# Altium footprint library Cty1.PcbLib: 869 footprints (part 30 of 55)
Each footprint in its own frame and in the unit in brackets; x right, y up, seen from the top. Pads: shape width x height; smd on the part's side, far side on the other; paste and mask are expansions set on the pad; w line width, h text height; cw(c..) or ccw(c..) is an arc to the next point about the centre after c.
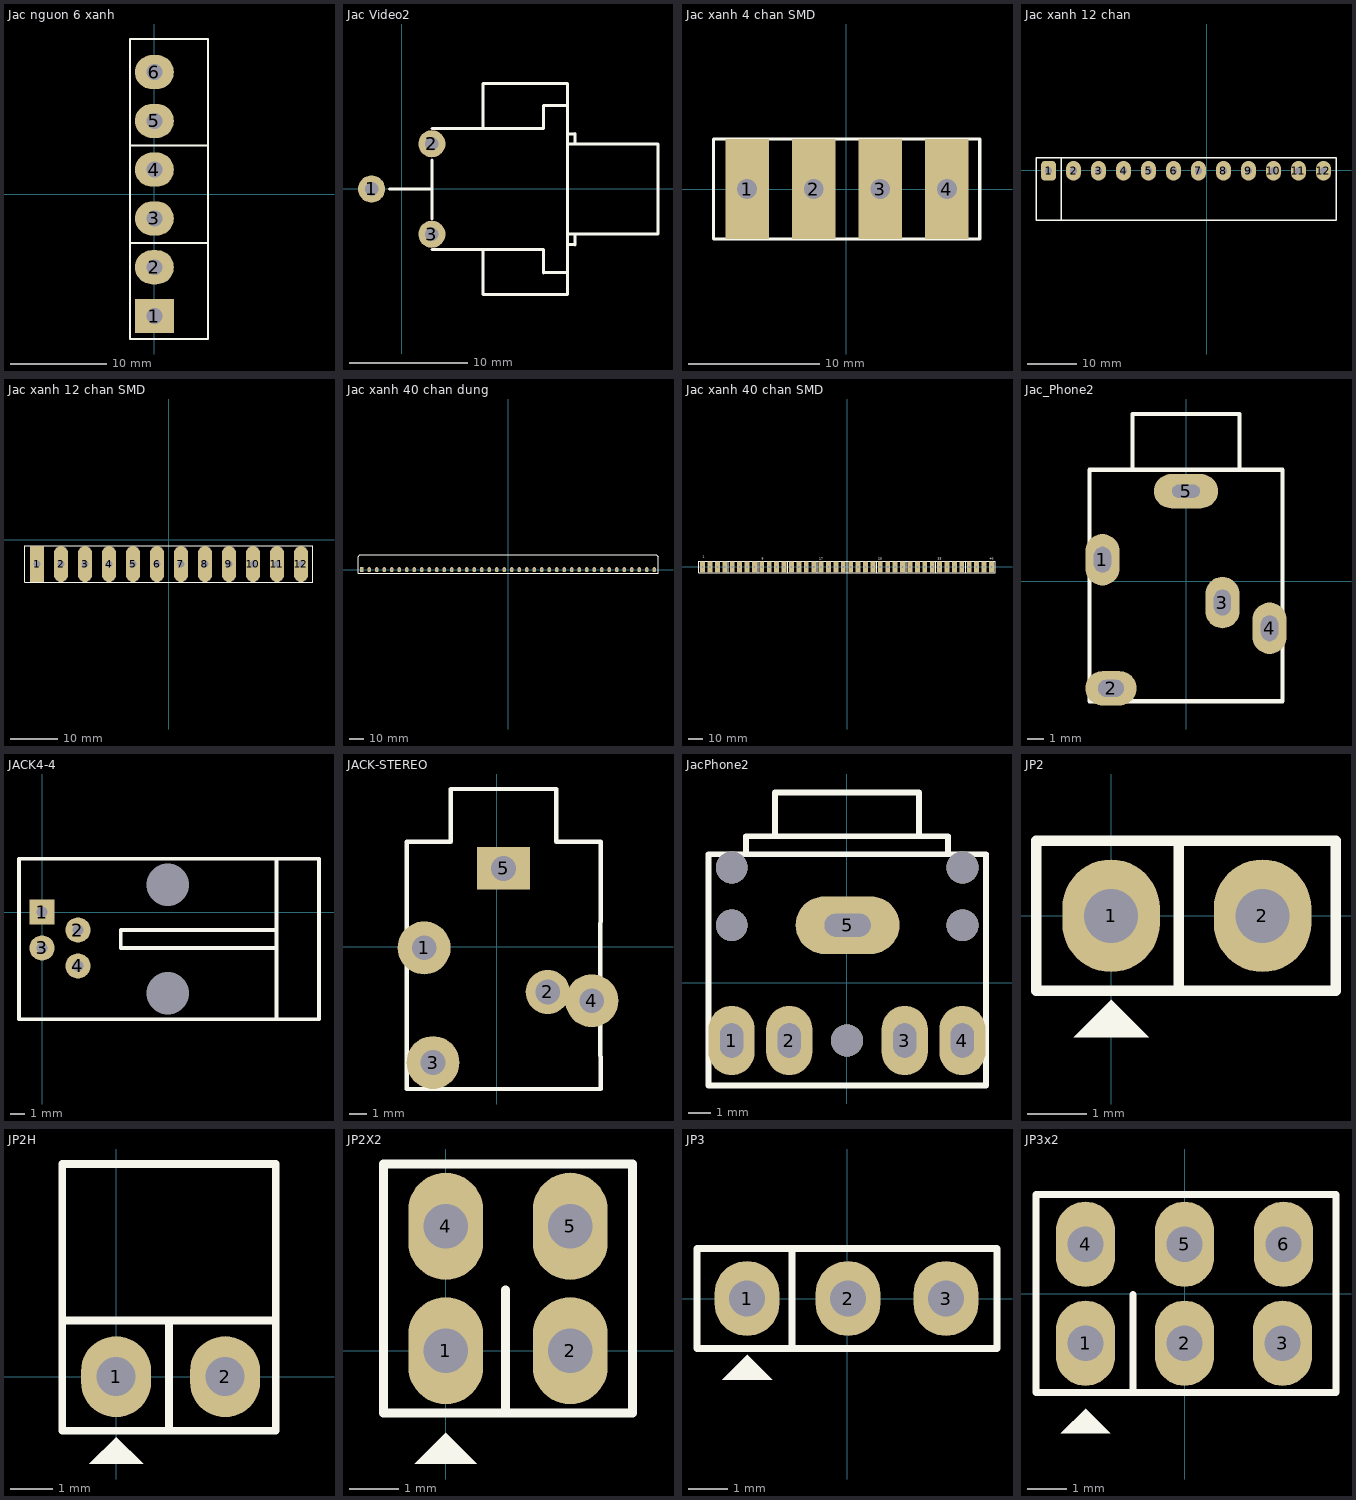
[diagram p29: the footprints below, top view; thin cyan lines are the x and y axes]

## Jac nguon 6 xanh [mil] "Cau dau nguon xanh"
pads (6):
  rect 160x140 hole 65: 1(0,-500)
  oval 160x140 hole 65: 2(0,-300) 3(0,-100) 4(0,100) 5(0,300) 6(0,500)
Top Overlay:
  lines w8: -100,-200.25 215,-200.25 ; -100,200 215,199.75 ; -100,-594.25 220,-594.25 220,635.75 -100,635.75 -100,-594.25

## Jac Video2 [mil] "Jac Video Stereo"
pads (3):
  round 90 hole 45: 1(-100,0) 2(100,150) 3(100,-150)
Top Overlay:
  lines w10: -40,0 101,0 ; 100,-200 470,-200 ; 100,200 470,200 470,277 550,277 ; 101,-99 101,96 ; 270,200 270,350 550,350 ; 470,-277 548,-277 549,-276 ; 550,-277 550,-350 270,-350 ; 550,-150 850,-150 850,150 550,150 ; 551,-184 574,-184 575,-185 575,-151 ; 551,183 574,183 575,184 575,150 ; 270,-350 270,-200 270,-350 ; 470,-200 470,-278 470,-200 ; 550,277 550,350 ; 550,277 550,350 ; 550,-275 550,275 550,-275

## Jac xanh 4 chan SMD [mil] "Jac xanh duc"
pads (4):
  rect 130x300 hole 59.05: 1(-297.27,0) 2(-97.73,0) 3(101.82,0) 4(301.36,0)
Top Overlay:
  lines w10: -397.73,-150 400,-150 400,150 -397.73,150 -397.73,-150

## Jac xanh 12 chan [mm] "Jac xanh duc"
pads (12):
  rrect50% 3x4 hole 1.5: 1(-32.131,-0.127)
  oval 3x4 hole 1.5: 2(-27.063,-0.127) 3(-21.994,-0.127) 4(-16.926,-0.127) 5(-11.857,-0.127) 6(-6.789,-0.127) 7(-1.72,-0.127) 8(3.348,-0.127) 9(8.417,-0.127) 10(13.485,-0.127) 11(18.554,-0.127) 12(23.622,-0.127)
Top Overlay:
  lines w0.254: -29.591,-10.16 -29.591,2.413 ; -34.671,-10.16 26.162,-10.16 26.162,2.54 -34.671,2.54 -34.671,-10.16

## Jac xanh 12 chan SMD [mm] "Jac xanh duc"
pads (12):
  rect 3x7.62 hole 1.5: 1(-27.871,-5.08)
  oval 3x7.62 hole 1.5: 2(-22.802,-5.08) 3(-17.734,-5.08) 4(-12.665,-5.08) 5(-7.597,-5.08) 6(-2.528,-5.08) 7(2.54,-5.08) 8(7.608,-5.08) 9(12.677,-5.08) 10(17.745,-5.08) 11(22.814,-5.08) 12(27.882,-5.08)
Top Overlay:
  lines w0.254: -30.422,-8.89 30.411,-8.89 30.411,-1.27 -30.422,-1.27 -30.422,-8.89

## Jac xanh 40 chan dung [mil] "Jac xanh duc"
height 200
pads (40):
  rect 100x130 hole 50: 1(-3900,0)
  oval 100x130 hole 50: 2(-3700,0) 3(-3500,0) 4(-3300,0) 5(-3100,0) 6(-2900,0) 7(-2700,0) 8(-2500,0) 9(-2300,0) 10(-2100,0) 11(-1900,0) 12(-1700,0) 13(-1500,0) 14(-1300,0) 15(-1100,0) 16(-900,0) 17(-700,0) 18(-500,0) 19(-300,0) 20(-100,0) 21(100,0) 22(300,0) 23(500,0) 24(700,0) 25(900,0) 26(1100,0) 27(1300,0) 28(1500,0) 29(1700,0) 30(1900,0) 31(2100,0) 32(2300,0) 33(2500,0) 34(2700,0) 35(2900,0) 36(3100,0) 37(3300,0) 38(3500,0) 39(3700,0) 40(3900,0)
Top Overlay:
  lines w13: -4000,-100 4000,-100 4000,350 3950,400 -3950,400 -4000,350 -4000,-100

## Jac xanh 40 chan SMD [mil] "Jac xanh duc"
pads (40):
  rect 130x300 hole 60: 1(-3900,0) 2(-3700,0) 3(-3500,0) 4(-3300,0) 5(-3100,0) 6(-2900,0) 7(-2700,0) 8(-2500,0) 9(-2300,0) 10(-2100,0) 11(-1900,0) 12(-1700,0) 13(-1500,0) 14(-1300,0) 15(-1100,0) 16(-900,0) 17(-700,0) 18(-500,0) 19(-300,0) 20(-100,0) 21(100,0) 22(300,0) 23(500,0) 24(700,0) 25(900,0) 26(1100,0) 27(1300,0) 28(1500,0) 29(1700,0) 30(1900,0) 31(2100,0) 32(2300,0) 33(2500,0) 34(2700,0) 35(2900,0) 36(3100,0) 37(3300,0) 38(3500,0) 39(3700,0) 40(3900,0)
Top Overlay:
  lines w10: -3200,-150 -3200,150 ; -2400,-150 -2400,150 ; -800,-150 -800,150 ; 0,-150 0,150 ; 800,-150 800,150 ; 1600,-150 1600,150 ; 2400,-150 2400,150 ; 3200,-150 3200,150 ; -1602.73,-150 4000,-150 4000,150 -1602.73,150 ; -1602.73,-150 -1602.73,150 ; -1602.73,-150 -3997.73,-150 -3997.73,150 -1602.73,150
  text "40" at 3850,200 h60
  text "33" at 2450,200 h60
  text "25" at 850,200 h60
  text "17" at -750,200 h60
  text "9" at -2300,200 h60
  text "1" at -3900,250 h60

## Jac_Phone2 [mil] "Jac Phone Stereo"
pads (5):
  oval 80x120 hole 40 slot 60 at 90 deg: 1(-195,50) 3(85,-50) 4(195,-110)
  oval 120x80 hole 40 slot 60 at 0 deg: 2(-175,-250)
  oval 150x80 hole 30 slot 65 at 0 deg: 5(0,210)
Top Overlay:
  lines w10: -125,262 -125,390 125,390 125,262 ; 223,-280 -225,-280 ; -225,-280 -225,260 ; -225,-280 -225,260 ; -225,260 225,260 ; 225,260 225,-280 225,260

## JACK4-4 [mil]
pads (6):
  rect 70x70 hole 31.5 unplated: 1(0,0)
  round 70 hole 31.5 unplated: 2(100,-50) 3(0,-100) 4(100,-150)
  round 70 hole 118.11 unplated: ""(350,-225.98) ""(350,75.98)
Top Overlay:
  lines w10: 651.97,-297.64 651.97,-98 ; 651.97,-97 651.97,-50 219,-50 219,-100 651.97,-100 651.97,-86 ; 651.97,-54 651.97,147.64 ; -64,-297.64 770.08,-297.64 770.08,147.64 -64,147.64 -64,-297.64

## JACK-STEREO [mm]
pads (5):
  round 3 hole 1.4: 1(-4.122,-0.061) 3(-3.622,-6.561) 4(5.378,-3.061)
  round 2.5 hole 1.4: 2(2.878,-2.561)
  rect 3x2.4 hole 1.4: 5(0.378,4.439)
Top Overlay:
  lines w0.254: 5.864,-4.35 5.878,-8.061 -5.122,-8.061 -5.122,4.439 -5.122,5.939 -2.625,5.939 -2.625,8.939 0.375,8.939 3.375,8.939 3.375,5.939 5.878,5.939 5.878,4.439 5.864,-1.708

## JacPhone2 [mil] "Jac Phone Stereo"
pads (5):
  oval 80x120 hole 40 slot 60 at 90 deg: 1(-200,-100) 2(-100,-100) 3(100,-100) 4(200,-100)
  oval 180x100 hole 40 slot 80 at 0 deg: 5(1,100)
via 200,100 diameter 55 hole 55
via -200,100 diameter 55 hole 55
via 0,-100 diameter 55 hole 55
via 200,200 diameter 55 hole 55
via -200,200 diameter 55 hole 55
Top Overlay:
  lines w10: -240,219 -240,-178 ; -175,224 -175,254 175,254 175,226 174,225 ; -125,255 -125,330 125,330 ; 125,329 125,256 126,255 ; 240,-178 -240,-178 ; -240,-178 -240,223 241,223 241,-178 -240,-178
3D body "SW3dPS-CONNECTOR, PHONE JACK, STEREO, 3.5 MM, SEE-PLUS ST-3536-02HG.STEP": height 394.3, standoff -137.19, extent -239,-201.56 233.44,353.56

## JP2 [mil]
pads (2):
  oval 65x75 hole 36: 1(0,0) 2(101,0)
Top Overlay:
  region: 0,-56 -25,-81 25,-81
  lines w7: 45,-50 45,49 ; -50,-50 -50,50 150,50 150,-50 -50,-50
3D body "JP2.stp": height 323.44, standoff -117.51, extent -48.03,-50 148.03,48.43

## JP2H [mil]
pads (2):
  oval 65x75 hole 36: 1(0,0) 2(101,0)
Top Overlay:
  region: 0,-56 -25,-81 25,-81
  lines w7: 49,-50 49,49 ; 148,54 148,197 -50,197 -50,52 ; -50,52 148,52 148,-50 -50,-50 -50,52
3D body "JP2H.stp": height 99.03, standoff -93.89, extent -44.13,-14.29 148,424.29

## JP2X2 [mil]
pads (4):
  oval 60x86 hole 36: 1(0,0) 2(100,0) 4(0,100) 5(100,100)
Top Overlay:
  region: 0,-66 -25,-91 25,-91
  lines w7: 48,-50 48,49 ; -50,-50 150,-50 150,150 -50,150 -50,50 -50,-50
3D body "JP2X2.stp": height 335.25, standoff -117.51, extent -49.99,-49.99 150.01,150.01

## JP3 [mil] "Jumper 3"
height 200
pads (3):
  oval 65x75 hole 36: 1(-100,0) 2(1,0) 3(99,0)
Top Overlay:
  region: -100,-56 -125,-81 -75,-81
  lines w7: -55,-50 -55,49 ; -150,-50 150,-50 150,50 -150,50 -150,-50
3D body "User Library-PinHeaderX3.STEP": height 355.04, standoff -124.88, extent -150,-59.96 150,55

## JP3x2 [mil] "Connector 3x2"
height 200
pads (6):
  oval 60x86 hole 36: 1(-100,-50) 2(0,-50) 3(99,-50) 4(-100,50) 5(0,50) 6(100,50)
Top Overlay:
  region: -100,-116 -125,-141 -75,-141
  lines w7: -52,-100 -52,-1 ; -150,-100 153,-100 153,100 -150,100 -150,0 -150,-100
3D body "JP2-3.stp": height 335.24, standoff -117.51, extent -149.99,-100 150.01,100